# Altium integrated library Weidmueller_OMNIMATE_Power.IntLib: 508 symbols (part 3 of 9)
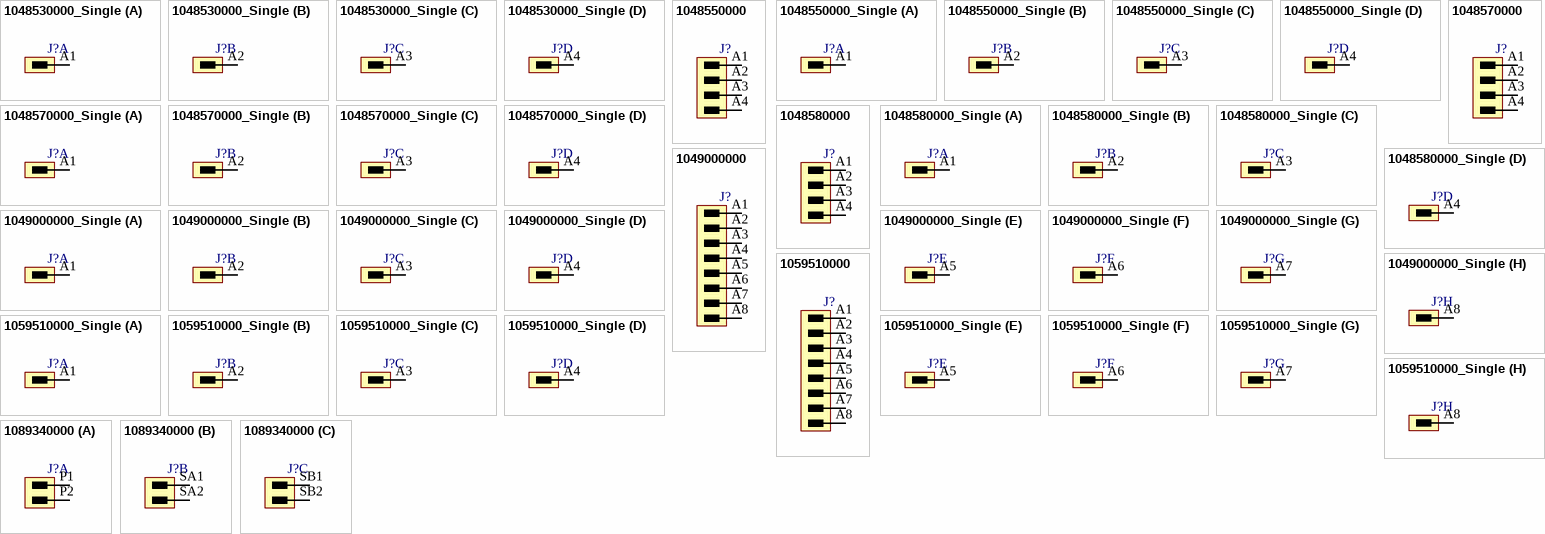
[diagram p33: symbols 1048530000_Single to 1089340000]

## 1059510000_Single
designator J?
OMNIMATE Power - series BL/SL 7.62HP; PartNumber: 1059510000; Manufacturer: Weidmueller; Short_text_for_material: SL 7.62HP/08/90G 3.2SN BK BX; Side_termination_characteristic: closed side; Mounting_onto_the_PCB: Solder connection; Pitch_mm: 7.62 mm; Pitch_inch: 0.3 inch; No_of_poles: 8; Outgoing_elbow: 90°; Solder_pin_length_mm: 3.2 mm; Contact_material: Cu-Leg; Contact_surface: tinned; Insulating_material: PBT; UL_94_flammability_rating: V-0; Rated_voltage_for_surge_voltage_class_pollution_degree_II_2: 630 V; Rated_voltage_use_group_B_UL_1059: 300 V; Rated_current_use_group_B_UL_1059: 20 A; PackageReference: SL_7_62HP_90G_08; Colour: Black; Packaging: Box; Qty: 50 PCS; Revision: V1; ComponentLink1Description: Manufacturer URL; ComponentLink1URL: http://www.weidmueller.com/; ComponentLink2Description: URL Link1; ComponentLink2URL: http://catalog.weidmueller.com/catalog/Start.do?localeId=en&ObjectID=1059510000
footprint SL_7_62HP_90G_08 (OMNIMATE Power - Serie BL/SL 7.62HP  SL 7.62HP/08/90G 3.2)
part A pins: A1
part B pins: A2
part C pins: A3
part D pins: A4
part E pins: A5
part F pins: A6
part G pins: A7
part H pins: A8

## 1089340000
designator J?
OMNIMATE Power - series BV/SV 7.62HP; PartNumber: 1089340000; Manufacturer: Weidmueller; Short_text_for_material: SV 7.62HP/02/270MSF2 SC/04R SN BK BX; Side_termination_characteristic: closed side; Note: Middle screw flange; Mounting_onto_the_PCB: Solder connection; Pitch_mm: 7.62 mm; Pitch_inch: 0.3 inch; No_of_poles: 2; Outgoing_elbow: 270°; Solder_pin_length_mm: 3.5 mm; Contact_material: Cu-Leg; Contact_surface: tinned; Insulating_material: PA GF; UL_94_flammability_rating: V-0; Rated_voltage_for_surge_voltage_class_pollution_degree_II_2: 1000 V; Rated_voltage_use_group_B_UL_1059: 300 V; Rated_current_use_group_B_UL_1059: 35 A; PackageReference: SV_7_62HP_02_SC_3_81_270MSF_04; Colour: Black; Packaging: Box; Qty: 60 PCS; Revision: V1; ComponentLink1Description: Manufacturer URL; ComponentLink1URL: http://www.weidmueller.com/; ComponentLink2Description: URL Link1; ComponentLink2URL: http://catalog.weidmueller.com/catalog/Start.do?localeId=en&ObjectID=1089340000
footprint SV_7_62HP_02_SC_3_81_270MSF_04 (OMNIMATE Power - Serie BV/SV 7.62HP  SV 7.62HP/02/270MSF2 SC/04R)
part A pins: P1, P2
part B pins: SA1, SA2
part C pins: SB1, SB2

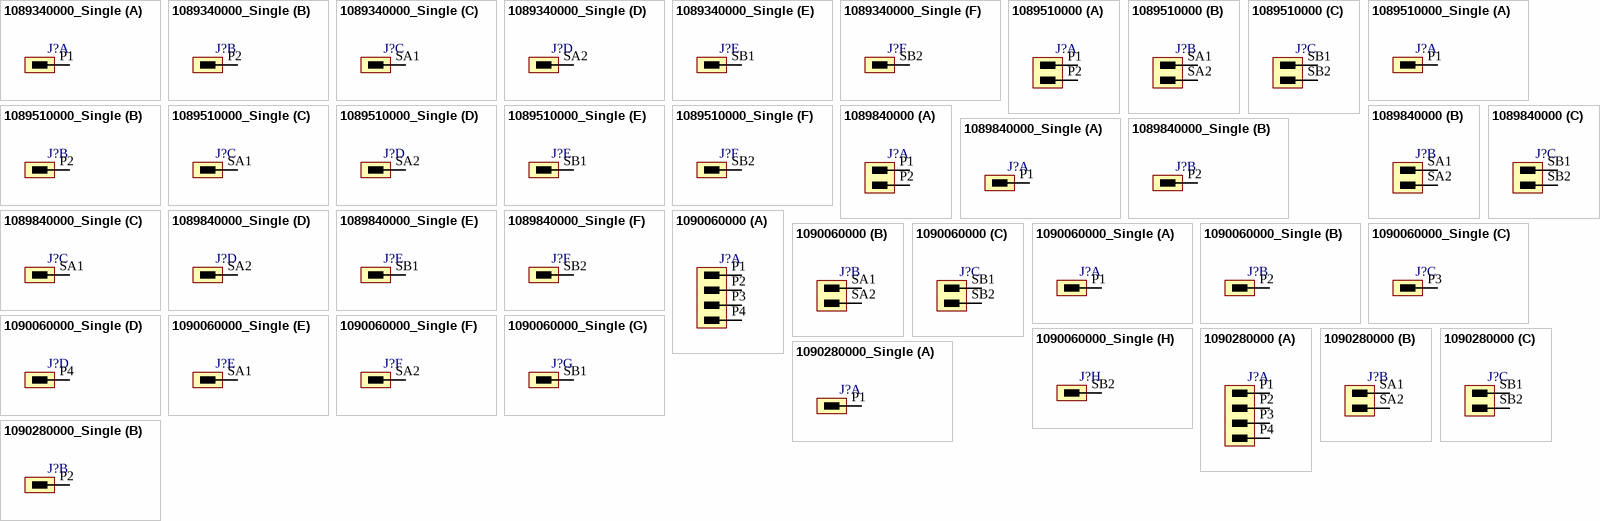
[diagram p6: symbols 1089340000_Single to 1090280000_Single]

## 1089340000_Single
designator J?
OMNIMATE Power - series BV/SV 7.62HP; PartNumber: 1089340000; Manufacturer: Weidmueller; Short_text_for_material: SV 7.62HP/02/270MSF2 SC/04R SN BK BX; Side_termination_characteristic: closed side; Note: Middle screw flange; Mounting_onto_the_PCB: Solder connection; Pitch_mm: 7.62 mm; Pitch_inch: 0.3 inch; No_of_poles: 2; Outgoing_elbow: 270°; Solder_pin_length_mm: 3.5 mm; Contact_material: Cu-Leg; Contact_surface: tinned; Insulating_material: PA GF; UL_94_flammability_rating: V-0; Rated_voltage_for_surge_voltage_class_pollution_degree_II_2: 1000 V; Rated_voltage_use_group_B_UL_1059: 300 V; Rated_current_use_group_B_UL_1059: 35 A; PackageReference: SV_7_62HP_02_SC_3_81_270MSF_04; Colour: Black; Packaging: Box; Qty: 60 PCS; Revision: V1; ComponentLink1Description: Manufacturer URL; ComponentLink1URL: http://www.weidmueller.com/; ComponentLink2Description: URL Link1; ComponentLink2URL: http://catalog.weidmueller.com/catalog/Start.do?localeId=en&ObjectID=1089340000
footprint SV_7_62HP_02_SC_3_81_270MSF_04 (OMNIMATE Power - Serie BV/SV 7.62HP  SV 7.62HP/02/270MSF2 SC/04R)
part A pins: P1
part B pins: P2
part C pins: SA1
part D pins: SA2
part E pins: SB1
part F pins: SB2

## 1089510000
designator J?
OMNIMATE Power - series BV/SV 7.62HP; PartNumber: 1089510000; Manufacturer: Weidmueller; Short_text_for_material: SV 7.62HP/02/90MSF2 SC/04R SN BK BX; Side_termination_characteristic: closed side; Note: Middle screw flange; Mounting_onto_the_PCB: Solder connection; Pitch_mm: 7.62 mm; Pitch_inch: 0.3 inch; No_of_poles: 2; Outgoing_elbow: 90°; Solder_pin_length_mm: 3.5 mm; Contact_material: Cu-Leg; Contact_surface: tinned; Insulating_material: PA GF; UL_94_flammability_rating: V-0; Rated_voltage_for_surge_voltage_class_pollution_degree_II_2: 1000 V; Rated_voltage_use_group_B_UL_1059: 300 V; Rated_current_use_group_B_UL_1059: 35 A; PackageReference: SV_7_62HP_02_SC_3_81_90MSF2_04; Colour: Black; Packaging: Box; Qty: 60 PCS; Revision: V1; ComponentLink1Description: Manufacturer URL; ComponentLink1URL: http://www.weidmueller.com/; ComponentLink2Description: URL Link1; ComponentLink2URL: http://catalog.weidmueller.com/catalog/Start.do?localeId=en&ObjectID=1089510000
footprint SV_7_62HP_02_SC_3_81_90MSF2_04 (OMNIMATE Power - Serie BV/SV 7.62HP  SV 7.62HP/02/90MSF4 SC/04R)
part A pins: P1, P2
part B pins: SA1, SA2
part C pins: SB1, SB2

## 1089510000_Single
designator J?
OMNIMATE Power - series BV/SV 7.62HP; PartNumber: 1089510000; Manufacturer: Weidmueller; Short_text_for_material: SV 7.62HP/02/90MSF2 SC/04R SN BK BX; Side_termination_characteristic: closed side; Note: Middle screw flange; Mounting_onto_the_PCB: Solder connection; Pitch_mm: 7.62 mm; Pitch_inch: 0.3 inch; No_of_poles: 2; Outgoing_elbow: 90°; Solder_pin_length_mm: 3.5 mm; Contact_material: Cu-Leg; Contact_surface: tinned; Insulating_material: PA GF; UL_94_flammability_rating: V-0; Rated_voltage_for_surge_voltage_class_pollution_degree_II_2: 1000 V; Rated_voltage_use_group_B_UL_1059: 300 V; Rated_current_use_group_B_UL_1059: 35 A; PackageReference: SV_7_62HP_02_SC_3_81_90MSF2_04; Colour: Black; Packaging: Box; Qty: 60 PCS; Revision: V1; ComponentLink1Description: Manufacturer URL; ComponentLink1URL: http://www.weidmueller.com/; ComponentLink2Description: URL Link1; ComponentLink2URL: http://catalog.weidmueller.com/catalog/Start.do?localeId=en&ObjectID=1089510000
footprint SV_7_62HP_02_SC_3_81_90MSF2_04 (OMNIMATE Power - Serie BV/SV 7.62HP  SV 7.62HP/02/90MSF4 SC/04R)
part A pins: P1
part B pins: P2
part C pins: SA1
part D pins: SA2
part E pins: SB1
part F pins: SB2

## 1089840000
designator J?
OMNIMATE Power - series BV/SV 7.62HP; PartNumber: 1089840000; Manufacturer: Weidmueller; Short_text_for_material: SV 7.62HP/02/90G SC/04R SN BK BX; Side_termination_characteristic: closed side; Mounting_onto_the_PCB: Solder connection; Pitch_mm: 7.62 mm; Pitch_inch: 0.3 inch; No_of_poles: 2; Outgoing_elbow: 90°; Solder_pin_length_mm: 3.5 mm; Contact_material: Cu-Leg; Contact_surface: tinned; Insulating_material: PA GF; UL_94_flammability_rating: V-0; Rated_voltage_for_surge_voltage_class_pollution_degree_II_2: 1000 V; Rated_voltage_use_group_B_UL_1059: 300 V; Rated_current_use_group_B_UL_1059: 35 A; PackageReference: SV_7_62HP_02_SC_3_81_90_04; Colour: Black; Packaging: Box; Qty: 78 PCS; Revision: V1; ComponentLink1Description: Manufacturer URL; ComponentLink1URL: http://www.weidmueller.com/; ComponentLink2Description: URL Link1; ComponentLink2URL: http://catalog.weidmueller.com/catalog/Start.do?localeId=en&ObjectID=1089840000
footprint SV_7_62HP_02_SC_3_81_90_04 (OMNIMATE Power - Serie BV/SV 7.62HP  SV 7.62HP/02/90G SC/08R)
part A pins: P1, P2
part B pins: SA1, SA2
part C pins: SB1, SB2

## 1089840000_Single
designator J?
OMNIMATE Power - series BV/SV 7.62HP; PartNumber: 1089840000; Manufacturer: Weidmueller; Short_text_for_material: SV 7.62HP/02/90G SC/04R SN BK BX; Side_termination_characteristic: closed side; Mounting_onto_the_PCB: Solder connection; Pitch_mm: 7.62 mm; Pitch_inch: 0.3 inch; No_of_poles: 2; Outgoing_elbow: 90°; Solder_pin_length_mm: 3.5 mm; Contact_material: Cu-Leg; Contact_surface: tinned; Insulating_material: PA GF; UL_94_flammability_rating: V-0; Rated_voltage_for_surge_voltage_class_pollution_degree_II_2: 1000 V; Rated_voltage_use_group_B_UL_1059: 300 V; Rated_current_use_group_B_UL_1059: 35 A; PackageReference: SV_7_62HP_02_SC_3_81_90_04; Colour: Black; Packaging: Box; Qty: 78 PCS; Revision: V1; ComponentLink1Description: Manufacturer URL; ComponentLink1URL: http://www.weidmueller.com/; ComponentLink2Description: URL Link1; ComponentLink2URL: http://catalog.weidmueller.com/catalog/Start.do?localeId=en&ObjectID=1089840000
footprint SV_7_62HP_02_SC_3_81_90_04 (OMNIMATE Power - Serie BV/SV 7.62HP  SV 7.62HP/02/90G SC/08R)
part A pins: P1
part B pins: P2
part C pins: SA1
part D pins: SA2
part E pins: SB1
part F pins: SB2

## 1090060000
designator J?
OMNIMATE Power - series BV/SV 7.62HP; PartNumber: 1090060000; Manufacturer: Weidmueller; Short_text_for_material: SV 7.62HP/04/270MSF4 SC/04R SN BK BX; Side_termination_characteristic: closed side; Note: Middle screw flange; Mounting_onto_the_PCB: Solder connection; Pitch_mm: 7.62 mm; Pitch_inch: 0.3 inch; No_of_poles: 4; Outgoing_elbow: 270°; Solder_pin_length_mm: 3.5 mm; Contact_material: Cu-Leg; Contact_surface: tinned; Insulating_material: PA GF; UL_94_flammability_rating: V-0; Rated_voltage_for_surge_voltage_class_pollution_degree_II_2: 1000 V; Rated_voltage_use_group_B_UL_1059: 300 V; Rated_current_use_group_B_UL_1059: 35 A; PackageReference: SV_7_62HP_04_SC_3_81_270MSF_04; Colour: Black; Packaging: Box; Qty: 36 PCS; Revision: V1; ComponentLink1Description: Manufacturer URL; ComponentLink1URL: http://www.weidmueller.com/; ComponentLink2Description: URL Link1; ComponentLink2URL: http://catalog.weidmueller.com/catalog/Start.do?localeId=en&ObjectID=1090060000
footprint SV_7_62HP_04_SC_3_81_270MSF_04 (OMNIMATE Power - Serie BV/SV 7.62HP  SV 7.62HP/04/270MSF4 SC/04)
part A pins: P1, P2, P3, P4
part B pins: SA1, SA2
part C pins: SB1, SB2

## 1090060000_Single
designator J?
OMNIMATE Power - series BV/SV 7.62HP; PartNumber: 1090060000; Manufacturer: Weidmueller; Short_text_for_material: SV 7.62HP/04/270MSF4 SC/04R SN BK BX; Side_termination_characteristic: closed side; Note: Middle screw flange; Mounting_onto_the_PCB: Solder connection; Pitch_mm: 7.62 mm; Pitch_inch: 0.3 inch; No_of_poles: 4; Outgoing_elbow: 270°; Solder_pin_length_mm: 3.5 mm; Contact_material: Cu-Leg; Contact_surface: tinned; Insulating_material: PA GF; UL_94_flammability_rating: V-0; Rated_voltage_for_surge_voltage_class_pollution_degree_II_2: 1000 V; Rated_voltage_use_group_B_UL_1059: 300 V; Rated_current_use_group_B_UL_1059: 35 A; PackageReference: SV_7_62HP_04_SC_3_81_270MSF_04; Colour: Black; Packaging: Box; Qty: 36 PCS; Revision: V1; ComponentLink1Description: Manufacturer URL; ComponentLink1URL: http://www.weidmueller.com/; ComponentLink2Description: URL Link1; ComponentLink2URL: http://catalog.weidmueller.com/catalog/Start.do?localeId=en&ObjectID=1090060000
footprint SV_7_62HP_04_SC_3_81_270MSF_04 (OMNIMATE Power - Serie BV/SV 7.62HP  SV 7.62HP/04/270MSF4 SC/04)
part A pins: P1
part B pins: P2
part C pins: P3
part D pins: P4
part E pins: SA1
part F pins: SA2
part G pins: SB1
part H pins: SB2

## 1090280000
designator J?
OMNIMATE Power - series BV/SV 7.62HP; PartNumber: 1090280000; Manufacturer: Weidmueller; Short_text_for_material: SV 7.62HP/04/90G SC/04R SN BK BX; Side_termination_characteristic: closed side; Mounting_onto_the_PCB: Solder connection; Pitch_mm: 7.62 mm; Pitch_inch: 0.3 inch; No_of_poles: 4; Outgoing_elbow: 90°; Solder_pin_length_mm: 3.5 mm; Contact_material: Cu-Leg; Contact_surface: tinned; Insulating_material: PA GF; UL_94_flammability_rating: V-0; Rated_voltage_for_surge_voltage_class_pollution_degree_II_2: 1000 V; Rated_voltage_use_group_B_UL_1059: 300 V; Rated_current_use_group_B_UL_1059: 35 A; PackageReference: SV_7_62HP_04_SC_3_81_90_04; Colour: Black; Packaging: Box; Qty: 48 PCS; Revision: V1; ComponentLink1Description: Manufacturer URL; ComponentLink1URL: http://www.weidmueller.com/; ComponentLink2Description: URL Link1; ComponentLink2URL: http://catalog.weidmueller.com/catalog/Start.do?localeId=en&ObjectID=1090280000
footprint SV_7_62HP_04_SC_3_81_90_04 (OMNIMATE Power - Serie BV/SV 7.62HP  SV 7.62HP/04/90G SC/04R)
part A pins: P1, P2, P3, P4
part B pins: SA1, SA2
part C pins: SB1, SB2

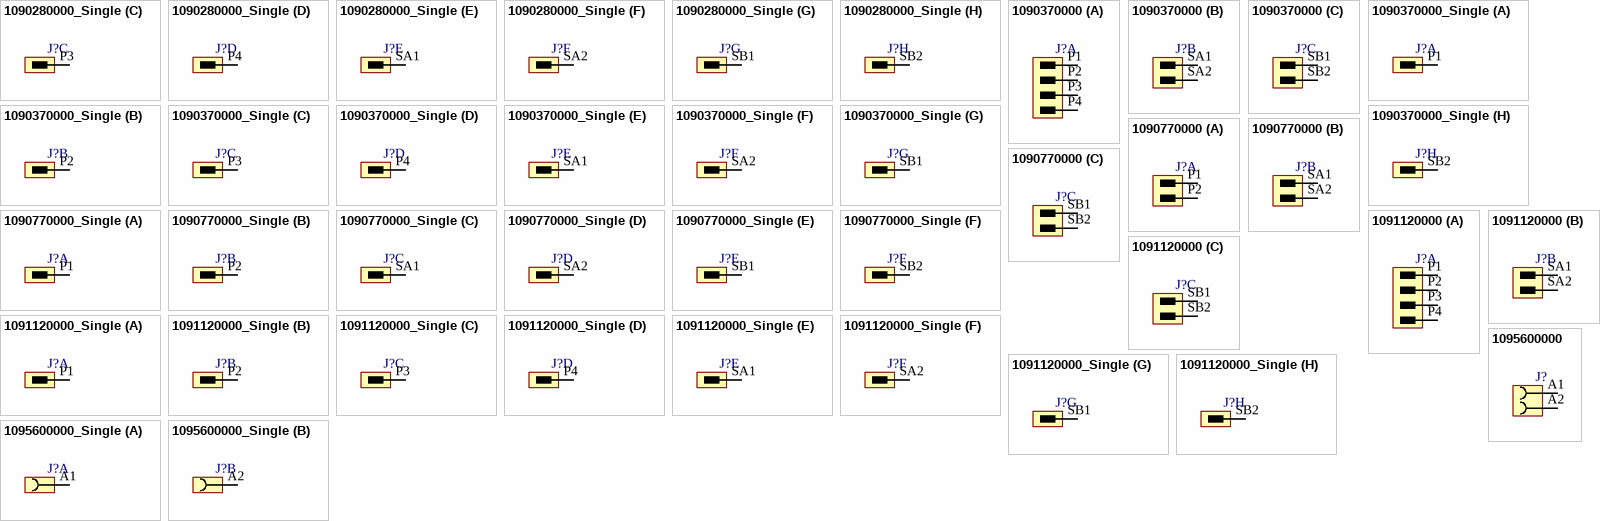
[diagram p7: symbols 1090280000_Single to 1095600000_Single]

## 1090280000_Single
designator J?
OMNIMATE Power - series BV/SV 7.62HP; PartNumber: 1090280000; Manufacturer: Weidmueller; Short_text_for_material: SV 7.62HP/04/90G SC/04R SN BK BX; Side_termination_characteristic: closed side; Mounting_onto_the_PCB: Solder connection; Pitch_mm: 7.62 mm; Pitch_inch: 0.3 inch; No_of_poles: 4; Outgoing_elbow: 90°; Solder_pin_length_mm: 3.5 mm; Contact_material: Cu-Leg; Contact_surface: tinned; Insulating_material: PA GF; UL_94_flammability_rating: V-0; Rated_voltage_for_surge_voltage_class_pollution_degree_II_2: 1000 V; Rated_voltage_use_group_B_UL_1059: 300 V; Rated_current_use_group_B_UL_1059: 35 A; PackageReference: SV_7_62HP_04_SC_3_81_90_04; Colour: Black; Packaging: Box; Qty: 48 PCS; Revision: V1; ComponentLink1Description: Manufacturer URL; ComponentLink1URL: http://www.weidmueller.com/; ComponentLink2Description: URL Link1; ComponentLink2URL: http://catalog.weidmueller.com/catalog/Start.do?localeId=en&ObjectID=1090280000
footprint SV_7_62HP_04_SC_3_81_90_04 (OMNIMATE Power - Serie BV/SV 7.62HP  SV 7.62HP/04/90G SC/04R)
part A pins: P1
part B pins: P2
part C pins: P3
part D pins: P4
part E pins: SA1
part F pins: SA2
part G pins: SB1
part H pins: SB2

## 1090370000
designator J?
OMNIMATE Power - series BV/SV 7.62HP; PartNumber: 1090370000; Manufacturer: Weidmueller; Short_text_for_material: SV 7.62HP/04/90MSF4 SC/04R SN BK BX; Side_termination_characteristic: closed side; Note: Middle screw flange; Mounting_onto_the_PCB: Solder connection; Pitch_mm: 7.62 mm; Pitch_inch: 0.3 inch; No_of_poles: 4; Outgoing_elbow: 90°; Solder_pin_length_mm: 3.5 mm; Contact_material: Cu-Leg; Contact_surface: tinned; Insulating_material: PA GF; UL_94_flammability_rating: V-0; Rated_voltage_for_surge_voltage_class_pollution_degree_II_2: 1000 V; Rated_voltage_use_group_B_UL_1059: 300 V; Rated_current_use_group_B_UL_1059: 35 A; PackageReference: SV_7_62HP_04_SC_3_81_90MSF4_04; Colour: Black; Packaging: Box; Qty: 36 PCS; Revision: V1; ComponentLink1Description: Manufacturer URL; ComponentLink1URL: http://www.weidmueller.com/; ComponentLink2Description: URL Link1; ComponentLink2URL: http://catalog.weidmueller.com/catalog/Start.do?localeId=en&ObjectID=1090370000
footprint SV_7_62HP_04_SC_3_81_90MSF4_04 (OMNIMATE Power - Serie BV/SV 7.62HP  SV 7.62HP/04/90MSF4 SC/04R)
part A pins: P1, P2, P3, P4
part B pins: SA1, SA2
part C pins: SB1, SB2

## 1090370000_Single
designator J?
OMNIMATE Power - series BV/SV 7.62HP; PartNumber: 1090370000; Manufacturer: Weidmueller; Short_text_for_material: SV 7.62HP/04/90MSF4 SC/04R SN BK BX; Side_termination_characteristic: closed side; Note: Middle screw flange; Mounting_onto_the_PCB: Solder connection; Pitch_mm: 7.62 mm; Pitch_inch: 0.3 inch; No_of_poles: 4; Outgoing_elbow: 90°; Solder_pin_length_mm: 3.5 mm; Contact_material: Cu-Leg; Contact_surface: tinned; Insulating_material: PA GF; UL_94_flammability_rating: V-0; Rated_voltage_for_surge_voltage_class_pollution_degree_II_2: 1000 V; Rated_voltage_use_group_B_UL_1059: 300 V; Rated_current_use_group_B_UL_1059: 35 A; PackageReference: SV_7_62HP_04_SC_3_81_90MSF4_04; Colour: Black; Packaging: Box; Qty: 36 PCS; Revision: V1; ComponentLink1Description: Manufacturer URL; ComponentLink1URL: http://www.weidmueller.com/; ComponentLink2Description: URL Link1; ComponentLink2URL: http://catalog.weidmueller.com/catalog/Start.do?localeId=en&ObjectID=1090370000
footprint SV_7_62HP_04_SC_3_81_90MSF4_04 (OMNIMATE Power - Serie BV/SV 7.62HP  SV 7.62HP/04/90MSF4 SC/04R)
part A pins: P1
part B pins: P2
part C pins: P3
part D pins: P4
part E pins: SA1
part F pins: SA2
part G pins: SB1
part H pins: SB2

## 1090770000
designator J?
OMNIMATE Power - series BV/SV 7.62HP; PartNumber: 1090770000; Manufacturer: Weidmueller; Short_text_for_material: SV 7.62HP/02/270G SC/04R SN BK BX; Side_termination_characteristic: closed side; Mounting_onto_the_PCB: Solder connection; Pitch_mm: 7.62 mm; Pitch_inch: 0.3 inch; No_of_poles: 2; Outgoing_elbow: 270°; Solder_pin_length_mm: 3.5 mm; Contact_material: Cu-Leg; Contact_surface: tinned; Insulating_material: PA GF; UL_94_flammability_rating: V-0; Rated_voltage_for_surge_voltage_class_pollution_degree_II_2: 1000 V; Rated_voltage_use_group_B_UL_1059: 300 V; Rated_current_use_group_B_UL_1059: 35 A; PackageReference: SV_7_62HP_02_SC_3_81_270_04; Colour: Black; Packaging: Box; Qty: 78 PCS; Revision: V1; ComponentLink1Description: Manufacturer URL; ComponentLink1URL: http://www.weidmueller.com/; ComponentLink2Description: URL Link1; ComponentLink2URL: http://catalog.weidmueller.com/catalog/Start.do?localeId=en&ObjectID=1090770000
footprint SV_7_62HP_02_SC_3_81_270_04 (OMNIMATE Power - Serie BV/SV 7.62HP  SV 7.62HP/02/270G SC/04R)
part A pins: P1, P2
part B pins: SA1, SA2
part C pins: SB1, SB2

## 1090770000_Single
designator J?
OMNIMATE Power - series BV/SV 7.62HP; PartNumber: 1090770000; Manufacturer: Weidmueller; Short_text_for_material: SV 7.62HP/02/270G SC/04R SN BK BX; Side_termination_characteristic: closed side; Mounting_onto_the_PCB: Solder connection; Pitch_mm: 7.62 mm; Pitch_inch: 0.3 inch; No_of_poles: 2; Outgoing_elbow: 270°; Solder_pin_length_mm: 3.5 mm; Contact_material: Cu-Leg; Contact_surface: tinned; Insulating_material: PA GF; UL_94_flammability_rating: V-0; Rated_voltage_for_surge_voltage_class_pollution_degree_II_2: 1000 V; Rated_voltage_use_group_B_UL_1059: 300 V; Rated_current_use_group_B_UL_1059: 35 A; PackageReference: SV_7_62HP_02_SC_3_81_270_04; Colour: Black; Packaging: Box; Qty: 78 PCS; Revision: V1; ComponentLink1Description: Manufacturer URL; ComponentLink1URL: http://www.weidmueller.com/; ComponentLink2Description: URL Link1; ComponentLink2URL: http://catalog.weidmueller.com/catalog/Start.do?localeId=en&ObjectID=1090770000
footprint SV_7_62HP_02_SC_3_81_270_04 (OMNIMATE Power - Serie BV/SV 7.62HP  SV 7.62HP/02/270G SC/04R)
part A pins: P1
part B pins: P2
part C pins: SA1
part D pins: SA2
part E pins: SB1
part F pins: SB2

## 1091120000
designator J?
OMNIMATE Power - series BV/SV 7.62HP; PartNumber: 1091120000; Manufacturer: Weidmueller; Short_text_for_material: SV 7.62HP/04/270G SC/04R SN BK BX; Side_termination_characteristic: closed side; Mounting_onto_the_PCB: Solder connection; Pitch_mm: 7.62 mm; Pitch_inch: 0.3 inch; No_of_poles: 4; Outgoing_elbow: 270°; Solder_pin_length_mm: 3.5 mm; Contact_material: Cu-Leg; Contact_surface: tinned; Insulating_material: PA GF; UL_94_flammability_rating: V-0; Rated_voltage_for_surge_voltage_class_pollution_degree_II_2: 1000 V; Rated_voltage_use_group_B_UL_1059: 300 V; Rated_current_use_group_B_UL_1059: 35 A; PackageReference: SV_7_62HP_04_SC_3_81_270_04; Colour: Black; Packaging: Box; Qty: 48 PCS; Revision: V1; ComponentLink1Description: Manufacturer URL; ComponentLink1URL: http://www.weidmueller.com/; ComponentLink2Description: URL Link1; ComponentLink2URL: http://catalog.weidmueller.com/catalog/Start.do?localeId=en&ObjectID=1091120000
footprint SV_7_62HP_04_SC_3_81_270_04 (OMNIMATE Power - Serie BV/SV 7.62HP  SV 7.62HP/04/270G SC/04R)
part A pins: P1, P2, P3, P4
part B pins: SA1, SA2
part C pins: SB1, SB2

## 1091120000_Single
designator J?
OMNIMATE Power - series BV/SV 7.62HP; PartNumber: 1091120000; Manufacturer: Weidmueller; Short_text_for_material: SV 7.62HP/04/270G SC/04R SN BK BX; Side_termination_characteristic: closed side; Mounting_onto_the_PCB: Solder connection; Pitch_mm: 7.62 mm; Pitch_inch: 0.3 inch; No_of_poles: 4; Outgoing_elbow: 270°; Solder_pin_length_mm: 3.5 mm; Contact_material: Cu-Leg; Contact_surface: tinned; Insulating_material: PA GF; UL_94_flammability_rating: V-0; Rated_voltage_for_surge_voltage_class_pollution_degree_II_2: 1000 V; Rated_voltage_use_group_B_UL_1059: 300 V; Rated_current_use_group_B_UL_1059: 35 A; PackageReference: SV_7_62HP_04_SC_3_81_270_04; Colour: Black; Packaging: Box; Qty: 48 PCS; Revision: V1; ComponentLink1Description: Manufacturer URL; ComponentLink1URL: http://www.weidmueller.com/; ComponentLink2Description: URL Link1; ComponentLink2URL: http://catalog.weidmueller.com/catalog/Start.do?localeId=en&ObjectID=1091120000
footprint SV_7_62HP_04_SC_3_81_270_04 (OMNIMATE Power - Serie BV/SV 7.62HP  SV 7.62HP/04/270G SC/04R)
part A pins: P1
part B pins: P2
part C pins: P3
part D pins: P4
part E pins: SA1
part F pins: SA2
part G pins: SB1
part H pins: SB2

## 1095600000
designator J?
OMNIMATE Power - series BL/SL 7.62HP; PartNumber: 1095600000; Manufacturer: Weidmueller; Short_text_for_material: BLL 7.62HP/02/90LF SN OR BX; Side_termination_characteristic: Solder flange; Mounting_onto_the_PCB: Solder connection; Pitch_mm: 7.62 mm; Pitch_inch: 0.3 inch; No_of_poles: 2; Solder_pin_length_mm: 3.2 mm; Contact_surface: tinned; Insulating_material: PA GF; UL_94_flammability_rating: V-0; Rated_voltage_for_surge_voltage_class_pollution_degree_II_2: 630 V; Rated_current_min_no_of_poles_TU_20_deg_C: 24 A; Rated_voltage_use_group_B_UL_1059: 300 V; Rated_current_use_group_B_UL_1059: 20 A; PackageReference: BLL_7_62HP_90LF_02; Colour: Orange; Packaging: Box; Qty: 72 PCS; Revision: V1; ComponentLink1Description: Manufacturer URL; ComponentLink1URL: http://www.weidmueller.com/; ComponentLink2Description: URL Link1; ComponentLink2URL: http://catalog.weidmueller.com/catalog/Start.do?localeId=en&ObjectID=1095600000
footprint BLL_7_62HP_90LF_02 (OMNIMATE Power - Serie BL/SL 7.62HP  BLL 7.62HP/02/90)
pins: A1, A2

## 1095600000_Single
designator J?
OMNIMATE Power - series BL/SL 7.62HP; PartNumber: 1095600000; Manufacturer: Weidmueller; Short_text_for_material: BLL 7.62HP/02/90LF SN OR BX; Side_termination_characteristic: Solder flange; Mounting_onto_the_PCB: Solder connection; Pitch_mm: 7.62 mm; Pitch_inch: 0.3 inch; No_of_poles: 2; Solder_pin_length_mm: 3.2 mm; Contact_surface: tinned; Insulating_material: PA GF; UL_94_flammability_rating: V-0; Rated_voltage_for_surge_voltage_class_pollution_degree_II_2: 630 V; Rated_current_min_no_of_poles_TU_20_deg_C: 24 A; Rated_voltage_use_group_B_UL_1059: 300 V; Rated_current_use_group_B_UL_1059: 20 A; PackageReference: BLL_7_62HP_90LF_02; Colour: Orange; Packaging: Box; Qty: 72 PCS; Revision: V1; ComponentLink1Description: Manufacturer URL; ComponentLink1URL: http://www.weidmueller.com/; ComponentLink2Description: URL Link1; ComponentLink2URL: http://catalog.weidmueller.com/catalog/Start.do?localeId=en&ObjectID=1095600000
footprint BLL_7_62HP_90LF_02 (OMNIMATE Power - Serie BL/SL 7.62HP  BLL 7.62HP/02/90)
part A pins: A1
part B pins: A2

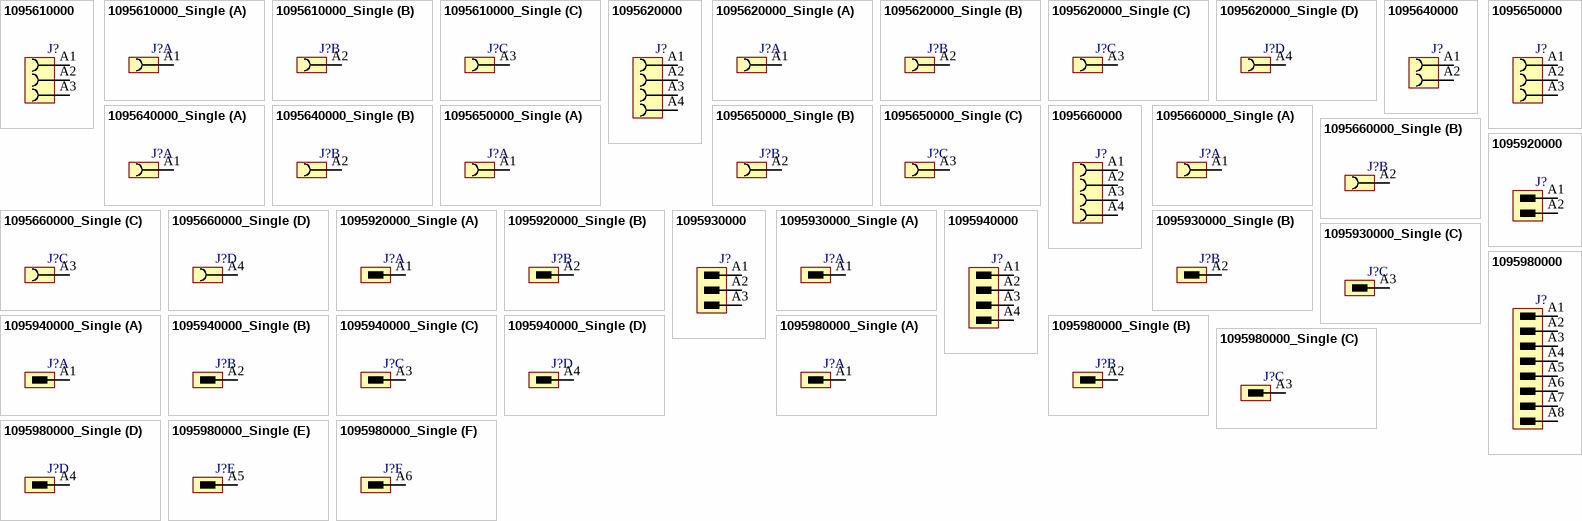
[diagram p8: symbols 1095610000 to 1095980000_Single]

## 1095610000
designator J?
OMNIMATE Power - series BL/SL 7.62HP; PartNumber: 1095610000; Manufacturer: Weidmueller; Short_text_for_material: BLL 7.62HP/03/90LF SN OR BX; Side_termination_characteristic: Solder flange; Mounting_onto_the_PCB: Solder connection; Pitch_mm: 7.62 mm; Pitch_inch: 0.3 inch; No_of_poles: 3; Solder_pin_length_mm: 3.2 mm; Contact_surface: tinned; Insulating_material: PA GF; UL_94_flammability_rating: V-0; Rated_voltage_for_surge_voltage_class_pollution_degree_II_2: 630 V; Rated_current_min_no_of_poles_TU_20_deg_C: 24 A; Rated_voltage_use_group_B_UL_1059: 300 V; Rated_current_use_group_B_UL_1059: 20 A; PackageReference: BLL_7_62HP_90LF_03; Colour: Orange; Packaging: Box; Qty: 54 PCS; Revision: V1; ComponentLink1Description: Manufacturer URL; ComponentLink1URL: http://www.weidmueller.com/; ComponentLink2Description: URL Link1; ComponentLink2URL: http://catalog.weidmueller.com/catalog/Start.do?localeId=en&ObjectID=1095610000
footprint BLL_7_62HP_90LF_03 (OMNIMATE Power - Serie BL/SL 7.62HP  BLL 7.62HP/03/90)
pins: A1, A2, A3

## 1095610000_Single
designator J?
OMNIMATE Power - series BL/SL 7.62HP; PartNumber: 1095610000; Manufacturer: Weidmueller; Short_text_for_material: BLL 7.62HP/03/90LF SN OR BX; Side_termination_characteristic: Solder flange; Mounting_onto_the_PCB: Solder connection; Pitch_mm: 7.62 mm; Pitch_inch: 0.3 inch; No_of_poles: 3; Solder_pin_length_mm: 3.2 mm; Contact_surface: tinned; Insulating_material: PA GF; UL_94_flammability_rating: V-0; Rated_voltage_for_surge_voltage_class_pollution_degree_II_2: 630 V; Rated_current_min_no_of_poles_TU_20_deg_C: 24 A; Rated_voltage_use_group_B_UL_1059: 300 V; Rated_current_use_group_B_UL_1059: 20 A; PackageReference: BLL_7_62HP_90LF_03; Colour: Orange; Packaging: Box; Qty: 54 PCS; Revision: V1; ComponentLink1Description: Manufacturer URL; ComponentLink1URL: http://www.weidmueller.com/; ComponentLink2Description: URL Link1; ComponentLink2URL: http://catalog.weidmueller.com/catalog/Start.do?localeId=en&ObjectID=1095610000
footprint BLL_7_62HP_90LF_03 (OMNIMATE Power - Serie BL/SL 7.62HP  BLL 7.62HP/03/90)
part A pins: A1
part B pins: A2
part C pins: A3

## 1095620000
designator J?
OMNIMATE Power - series BL/SL 7.62HP; PartNumber: 1095620000; Manufacturer: Weidmueller; Short_text_for_material: BLL 7.62HP/04/90LF SN OR BX; Side_termination_characteristic: Solder flange; Mounting_onto_the_PCB: Solder connection; Pitch_mm: 7.62 mm; Pitch_inch: 0.3 inch; No_of_poles: 4; Solder_pin_length_mm: 3.2 mm; Contact_surface: tinned; Insulating_material: PA GF; UL_94_flammability_rating: V-0; Rated_voltage_for_surge_voltage_class_pollution_degree_II_2: 630 V; Rated_current_min_no_of_poles_TU_20_deg_C: 24 A; Rated_voltage_use_group_B_UL_1059: 300 V; Rated_current_use_group_B_UL_1059: 20 A; PackageReference: BLL_7_62HP_90LF_04; Colour: Orange; Packaging: Box; Qty: 42 PCS; Revision: V1; ComponentLink1Description: Manufacturer URL; ComponentLink1URL: http://www.weidmueller.com/; ComponentLink2Description: URL Link1; ComponentLink2URL: http://catalog.weidmueller.com/catalog/Start.do?localeId=en&ObjectID=1095620000
footprint BLL_7_62HP_90LF_04 (OMNIMATE Power - Serie BL/SL 7.62HP  BLL 7.62HP/04/90)
pins: A1, A2, A3, A4

## 1095620000_Single
designator J?
OMNIMATE Power - series BL/SL 7.62HP; PartNumber: 1095620000; Manufacturer: Weidmueller; Short_text_for_material: BLL 7.62HP/04/90LF SN OR BX; Side_termination_characteristic: Solder flange; Mounting_onto_the_PCB: Solder connection; Pitch_mm: 7.62 mm; Pitch_inch: 0.3 inch; No_of_poles: 4; Solder_pin_length_mm: 3.2 mm; Contact_surface: tinned; Insulating_material: PA GF; UL_94_flammability_rating: V-0; Rated_voltage_for_surge_voltage_class_pollution_degree_II_2: 630 V; Rated_current_min_no_of_poles_TU_20_deg_C: 24 A; Rated_voltage_use_group_B_UL_1059: 300 V; Rated_current_use_group_B_UL_1059: 20 A; PackageReference: BLL_7_62HP_90LF_04; Colour: Orange; Packaging: Box; Qty: 42 PCS; Revision: V1; ComponentLink1Description: Manufacturer URL; ComponentLink1URL: http://www.weidmueller.com/; ComponentLink2Description: URL Link1; ComponentLink2URL: http://catalog.weidmueller.com/catalog/Start.do?localeId=en&ObjectID=1095620000
footprint BLL_7_62HP_90LF_04 (OMNIMATE Power - Serie BL/SL 7.62HP  BLL 7.62HP/04/90)
part A pins: A1
part B pins: A2
part C pins: A3
part D pins: A4

## 1095640000
designator J?
OMNIMATE Power - series BL/SL 7.62HP; PartNumber: 1095640000; Manufacturer: Weidmueller; Short_text_for_material: BLL 7.62HP/02/90LF SN BK BX; Side_termination_characteristic: Solder flange; Mounting_onto_the_PCB: Solder connection; Pitch_mm: 7.62 mm; Pitch_inch: 0.3 inch; No_of_poles: 2; Solder_pin_length_mm: 3.2 mm; Contact_material: Cu-Leg; Contact_surface: tinned; Insulating_material: PA GF; UL_94_flammability_rating: V-0; Rated_voltage_for_surge_voltage_class_pollution_degree_II_2: 630 V; Rated_voltage_use_group_B_UL_1059: 300 V; Rated_current_use_group_B_UL_1059: 20 A; PackageReference: BLL_7_62HP_90LF_02; Colour: Black; Packaging: Box; Qty: 72 PCS; Revision: V1; ComponentLink1Description: Manufacturer URL; ComponentLink1URL: http://www.weidmueller.com/; ComponentLink2Description: URL Link1; ComponentLink2URL: http://catalog.weidmueller.com/catalog/Start.do?localeId=en&ObjectID=1095640000
footprint BLL_7_62HP_90LF_02 (OMNIMATE Power - Serie BL/SL 7.62HP  BLL 7.62HP/02/90)
pins: A1, A2

## 1095640000_Single
designator J?
OMNIMATE Power - series BL/SL 7.62HP; PartNumber: 1095640000; Manufacturer: Weidmueller; Short_text_for_material: BLL 7.62HP/02/90LF SN BK BX; Side_termination_characteristic: Solder flange; Mounting_onto_the_PCB: Solder connection; Pitch_mm: 7.62 mm; Pitch_inch: 0.3 inch; No_of_poles: 2; Solder_pin_length_mm: 3.2 mm; Contact_material: Cu-Leg; Contact_surface: tinned; Insulating_material: PA GF; UL_94_flammability_rating: V-0; Rated_voltage_for_surge_voltage_class_pollution_degree_II_2: 630 V; Rated_voltage_use_group_B_UL_1059: 300 V; Rated_current_use_group_B_UL_1059: 20 A; PackageReference: BLL_7_62HP_90LF_02; Colour: Black; Packaging: Box; Qty: 72 PCS; Revision: V1; ComponentLink1Description: Manufacturer URL; ComponentLink1URL: http://www.weidmueller.com/; ComponentLink2Description: URL Link1; ComponentLink2URL: http://catalog.weidmueller.com/catalog/Start.do?localeId=en&ObjectID=1095640000
footprint BLL_7_62HP_90LF_02 (OMNIMATE Power - Serie BL/SL 7.62HP  BLL 7.62HP/02/90)
part A pins: A1
part B pins: A2

## 1095650000
designator J?
OMNIMATE Power - series BL/SL 7.62HP; PartNumber: 1095650000; Manufacturer: Weidmueller; Short_text_for_material: BLL 7.62HP/03/90LF SN BK BX; Side_termination_characteristic: Solder flange; Mounting_onto_the_PCB: Solder connection; Pitch_mm: 7.62 mm; Pitch_inch: 0.3 inch; No_of_poles: 3; Solder_pin_length_mm: 3.2 mm; Contact_material: Cu-Leg; Contact_surface: tinned; Insulating_material: PA GF; UL_94_flammability_rating: V-0; Rated_voltage_for_surge_voltage_class_pollution_degree_II_2: 630 V; Rated_voltage_use_group_B_UL_1059: 300 V; Rated_current_use_group_B_UL_1059: 20 A; PackageReference: BLL_7_62HP_90LF_03; Colour: Black; Packaging: Box; Qty: 54 PCS; Revision: V1; ComponentLink1Description: Manufacturer URL; ComponentLink1URL: http://www.weidmueller.com/; ComponentLink2Description: URL Link1; ComponentLink2URL: http://catalog.weidmueller.com/catalog/Start.do?localeId=en&ObjectID=1095650000
footprint BLL_7_62HP_90LF_03 (OMNIMATE Power - Serie BL/SL 7.62HP  BLL 7.62HP/03/90)
pins: A1, A2, A3

## 1095650000_Single
designator J?
OMNIMATE Power - series BL/SL 7.62HP; PartNumber: 1095650000; Manufacturer: Weidmueller; Short_text_for_material: BLL 7.62HP/03/90LF SN BK BX; Side_termination_characteristic: Solder flange; Mounting_onto_the_PCB: Solder connection; Pitch_mm: 7.62 mm; Pitch_inch: 0.3 inch; No_of_poles: 3; Solder_pin_length_mm: 3.2 mm; Contact_material: Cu-Leg; Contact_surface: tinned; Insulating_material: PA GF; UL_94_flammability_rating: V-0; Rated_voltage_for_surge_voltage_class_pollution_degree_II_2: 630 V; Rated_voltage_use_group_B_UL_1059: 300 V; Rated_current_use_group_B_UL_1059: 20 A; PackageReference: BLL_7_62HP_90LF_03; Colour: Black; Packaging: Box; Qty: 54 PCS; Revision: V1; ComponentLink1Description: Manufacturer URL; ComponentLink1URL: http://www.weidmueller.com/; ComponentLink2Description: URL Link1; ComponentLink2URL: http://catalog.weidmueller.com/catalog/Start.do?localeId=en&ObjectID=1095650000
footprint BLL_7_62HP_90LF_03 (OMNIMATE Power - Serie BL/SL 7.62HP  BLL 7.62HP/03/90)
part A pins: A1
part B pins: A2
part C pins: A3

## 1095660000
designator J?
OMNIMATE Power - series BL/SL 7.62HP; PartNumber: 1095660000; Manufacturer: Weidmueller; Short_text_for_material: BLL 7.62HP/04/90LF SN BK BX; Side_termination_characteristic: Solder flange; Mounting_onto_the_PCB: Solder connection; Pitch_mm: 7.62 mm; Pitch_inch: 0.3 inch; No_of_poles: 4; Solder_pin_length_mm: 3.2 mm; Contact_material: Cu-Leg; Contact_surface: tinned; Insulating_material: PA GF; UL_94_flammability_rating: V-0; Rated_voltage_for_surge_voltage_class_pollution_degree_II_2: 630 V; Rated_voltage_use_group_B_UL_1059: 300 V; Rated_current_use_group_B_UL_1059: 20 A; PackageReference: BLL_7_62HP_90LF_04; Colour: Black; Packaging: Box; Qty: 42 PCS; Revision: V1; ComponentLink1Description: Manufacturer URL; ComponentLink1URL: http://www.weidmueller.com/; ComponentLink2Description: URL Link1; ComponentLink2URL: http://catalog.weidmueller.com/catalog/Start.do?localeId=en&ObjectID=1095660000
footprint BLL_7_62HP_90LF_04 (OMNIMATE Power - Serie BL/SL 7.62HP  BLL 7.62HP/04/90)
pins: A1, A2, A3, A4

## 1095660000_Single
designator J?